# Altium schematic symbol library SparkFun.SCHLIB: 796 symbols (part 5 of 5)
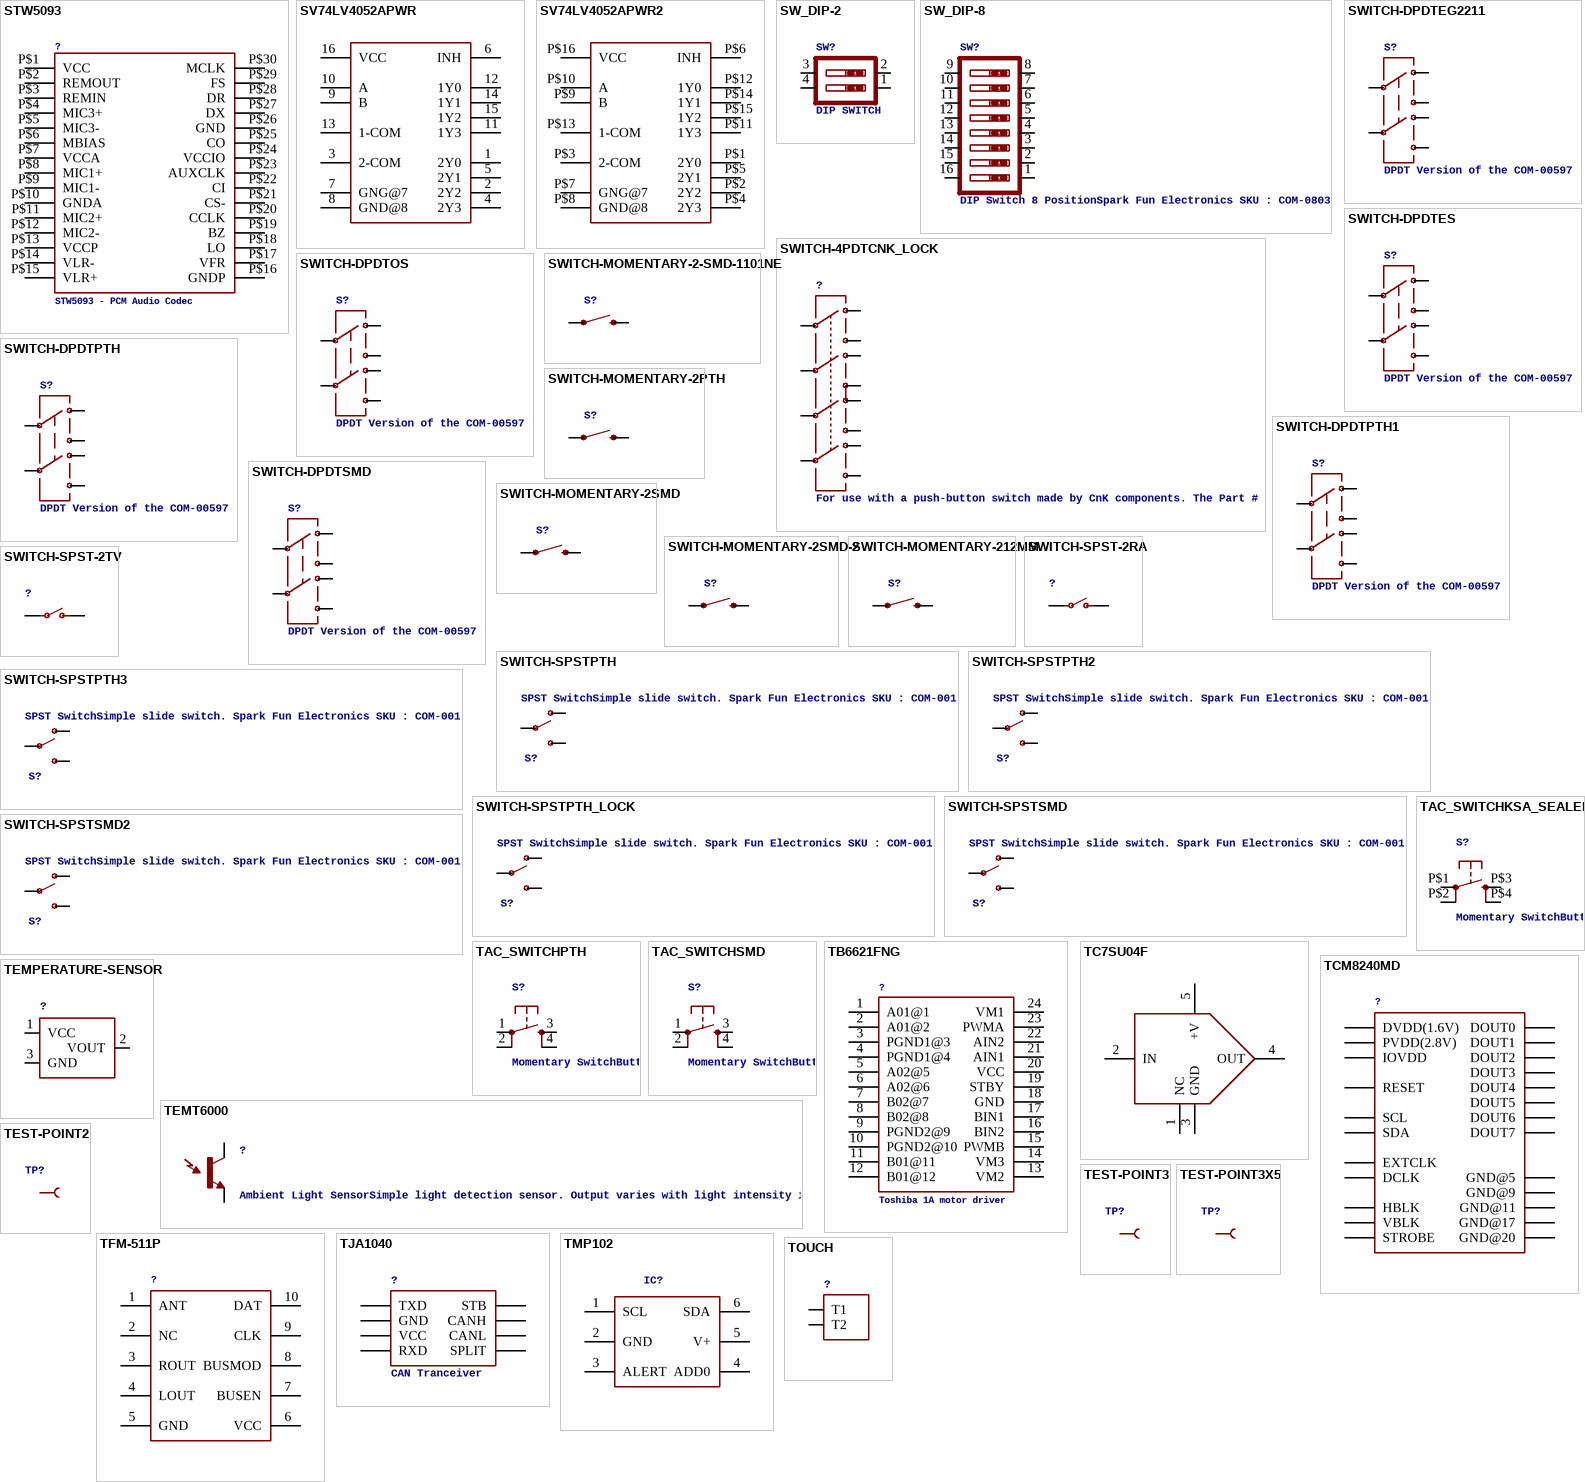
[diagram p40: symbols STW5093 to TOUCH]

## SWITCH-MOMENTARY-2SMD
designator S?
footprint TACTILE_SWITCH_SMD
pins: 1, 3 2

## SWITCH-MOMENTARY-2SMD-2
designator S?
footprint TACTILE_SWITCH_SMD-2
pins: 1 2, 2 1

## SWITCH-MOMENTARY-212MM
designator S?
footprint TACTILE-PTH-12MM
pins: 1, 3 2

## SWITCH-SPST-2RA
designator ?
footprint R_SW_TH
pins: P$3 O, P$4 P

## SWITCH-SPST-2TV
designator ?
footprint SWITCH-SPST-VERTICAL
pins: 1 O, 2 P

## SWITCH-SPSTPTH
designator S?, comment SPST SwitchSimple slide switch. Spark Fun Electronics SKU : COM-00102
footprint SWITCH-SPDT
pins: 1 O, 2 P, 3 S

## SWITCH-SPSTPTH2
designator S?, comment SPST SwitchSimple slide switch. Spark Fun Electronics SKU : COM-00102
footprint SWITCHE-DPDT
pins: 1 O, 2 P, 3 S

## SWITCH-SPSTPTH3
designator S?, comment SPST SwitchSimple slide switch. Spark Fun Electronics SKU : COM-00102
footprint R_SW_TH
pins: P$1 O, P$2 P, P$3 S

## SWITCH-SPSTPTH_LOCK
designator S?, comment SPST SwitchSimple slide switch. Spark Fun Electronics SKU : COM-00102
footprint SWITCH-SPDT_LOCK.007S
pins: 1 O, 2 P, 3 S

## SWITCH-SPSTSMD
designator S?, comment SPST SwitchSimple slide switch. Spark Fun Electronics SKU : COM-00102
footprint AYZ0202
pins: 1 O, 2 P, 3 S

## SWITCH-SPSTSMD2
designator S?, comment SPST SwitchSimple slide switch. Spark Fun Electronics SKU : COM-00102
footprint SWITCH-SPDT-SMD
pins: 1 O, 2 P, 3 S

## TAC_SWITCHKSA_SEALED
designator S?, comment Momentary SwitchButton commonly used for reset or general input. Spark Fun Electronics SKU : COM-00097
footprint KSA_SEALED_TAC_SWITCH
pins: P$1 1, P$2 2, P$3 3, P$4 4

## TAC_SWITCHPTH
designator S?, comment Momentary SwitchButton commonly used for reset or general input. Spark Fun Electronics SKU : COM-00097
footprint TACTILE-PTH
pins: 1, 2, 3, 4

## TAC_SWITCHSMD
designator S?, comment Momentary SwitchButton commonly used for reset or general input. Spark Fun Electronics SKU : COM-00097
footprint TACTILE_SWITCH_SMD
pins: 1, 2, 3, 4

## TB6621FNG
designator ?, comment Toshiba 1A motor driver
footprint SSOP24
pins: 1 A01@1, 2 A01@2, 3 PGND1@3, 4 PGND1@4, 5 A02@5, 6 A02@6, 7 B02@7, 8 B02@8, 9 PGND2@9, 10 PGND2@10, 11 B01@11, 12 B01@12, 13 VM2, 14 VM3, 15 PWMB, 16 BIN2, 17 BIN1, 18 GND, 19 STBY, 20 VCC, 21 AIN1, 22 AIN2, 23 PWMA, 24 VM1

## TC7SU04F
designator ?
footprint SOT23-5
pins: 1 NC, 2 IN, 3 GND, 4 OUT, 5 +V

## TCM8240MD
designator ?
footprint TCM8240MD
pins: P$1 DOUT3, P$2 DOUT2, P$3 DOUT1, P$4 DOUT0, P$5 GND@5, P$6 PVDD(2.8V), P$7 RESET, P$8 SCL, P$9 GND@9, P$10 SDA, P$11 GND@11, P$12 DVDD(1.6V), P$13 EXTCLK, P$14 STROBE, P$15 HBLK, P$16 VBLK, P$17 GND@17, P$18 IOVDD, P$19 DCLK, P$20 GND@20, P$21 DOUT7, P$22 DOUT6, P$23 DOUT5, P$24 DOUT4

## TEMPERATURE-SENSOR
designator ?
footprint TO-92
pins: 1 VCC, 2 VOUT, 3 GND

## TEMT6000
designator ?, comment Ambient Light SensorSimple light detection sensor. Output varies with light intensity input. Spark Fun Electronics SKU : COM-08348
footprint TEMT6000-SEN
pins: COLLECTOR C1, EMITTER E1

## TEST-POINT2
designator TP?
footprint PAD.02X.02
pins: P$1 1

## TEST-POINT3
designator TP?
footprint PAD.03X.03
pins: P$1 1

## TEST-POINT3X5
designator TP?
footprint PAD.03X.05
pins: P$1 1

## TFM-511P
designator ?
footprint TFM-511
pins: 1 ANT, 2 NC, 3 ROUT, 4 LOUT, 5 GND, 6 VCC, 7 BUSEN, 8 BUSMOD, 9 CLK, 10 DAT

## TJA1040
designator ?, comment CAN Tranceiver
footprint SO08
pins: 1 TXD, 2 GND, 3 VCC, 4 RXD, 5 SPLIT, 6 CANL, 7 CANH, 8 STB

## TMP102
designator IC?
footprint SOT563
pins: 1 SCL, 2 GND, 3 ALERT, 4 ADD0, 5 V+, 6 SDA

## TOUCH
designator ?
footprint TOUCH1
pins: P$1 T1, P$2 T2

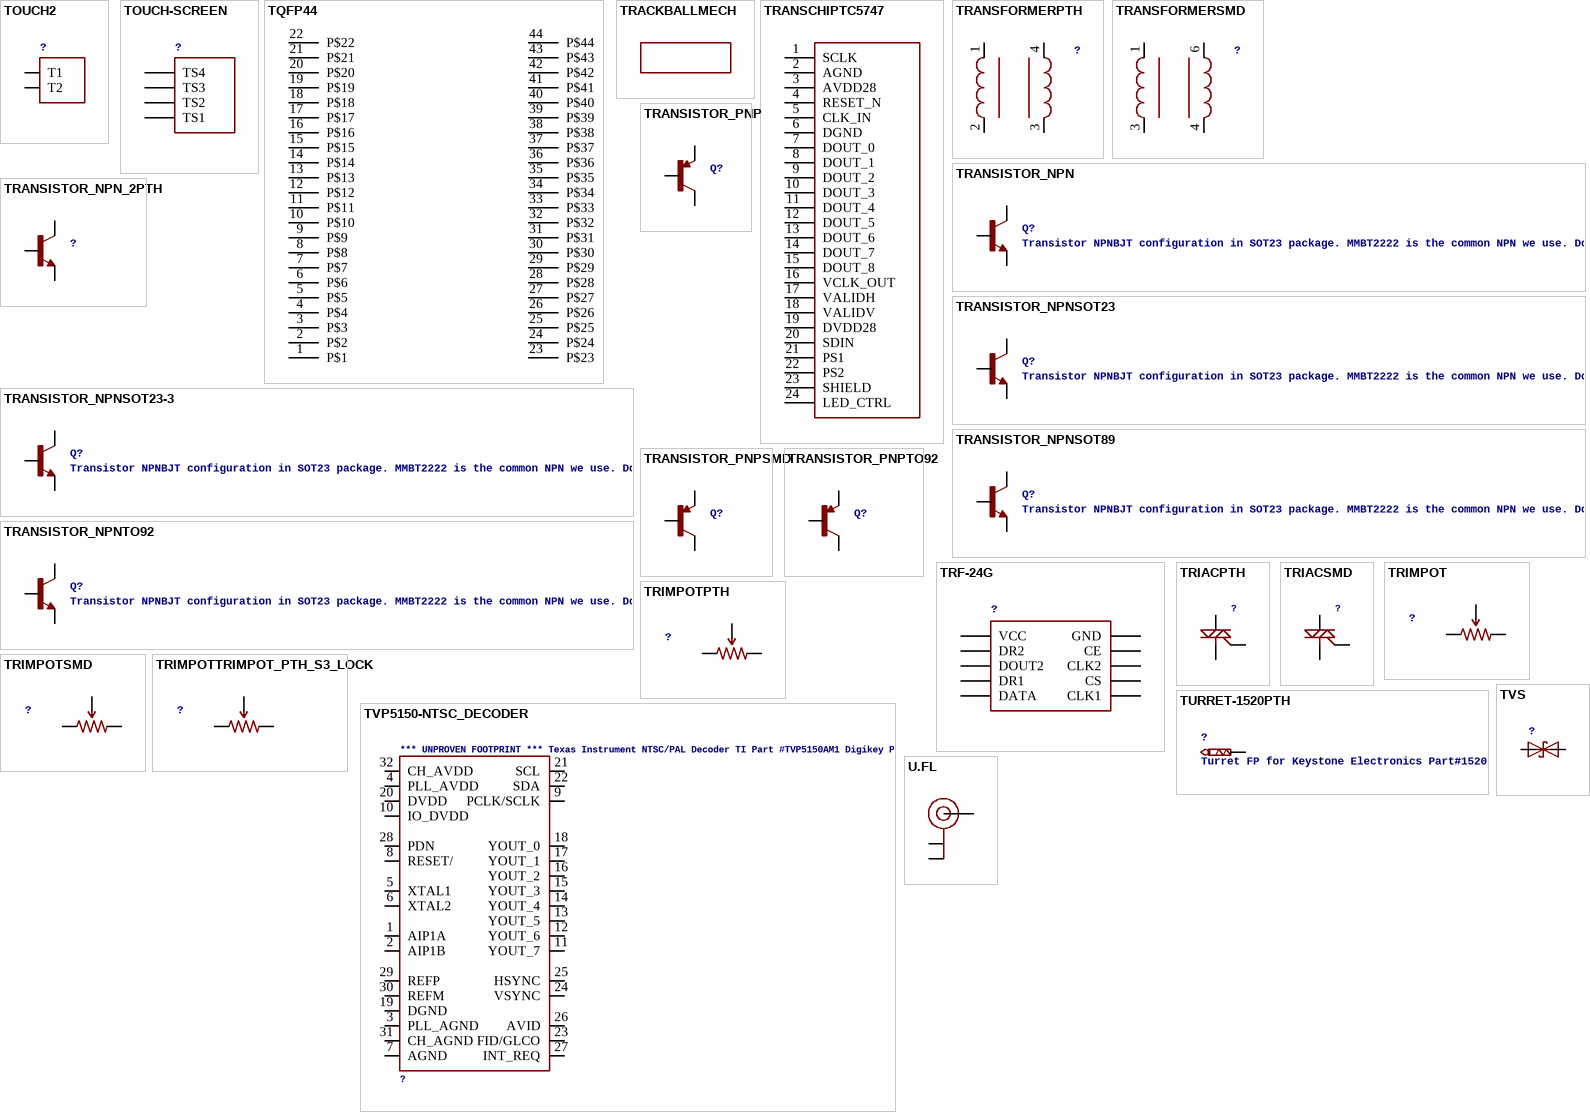
[diagram p32: symbols TOUCH2 to U.FL]

## TOUCH2
designator ?
footprint TOUCH2
pins: P$1 T1, P$4 T2

## TOUCH-SCREEN
designator ?
footprint TOUCH-SCREEN
pins: P$1 TS4, P$2 TS3, P$3 TS2, P$4 TS1

## TQFP44
designator ?
footprint TQFP44
pins: 1 P$1, 2 P$2, 3 P$3, 4 P$4, 5 P$5, 6 P$6, 7 P$7, 8 P$8, 9 P$9, 10 P$10, 11 P$11, 12 P$12, 13 P$13, 14 P$14, 15 P$15, 16 P$16, 17 P$17, 18 P$18, 19 P$19, 20 P$20, 21 P$21, 22 P$22, 23 P$23, 24 P$24, 25 P$25, 26 P$26, 27 P$27, 28 P$28, 29 P$29, 30 P$30, 31 P$31, 32 P$32, 33 P$33, 34 P$34, 35 P$35, 36 P$36, 37 P$37, 38 P$38, 39 P$39, 40 P$40, 41 P$41, 42 P$42, 43 P$43, 44 P$44

## TRACKBALLMECH
designator ?
footprint TRACKBALL

## TRANSCHIPTC5747
designator ?
footprint CAMERA_SFV24R-2ST_2
pins: 1 SCLK, 2 AGND, 3 AVDD28, 4 RESET_N, 5 CLK_IN, 6 DGND, 7 DOUT_0, 8 DOUT_1, 9 DOUT_2, 10 DOUT_3, 11 DOUT_4, 12 DOUT_5, 13 DOUT_6, 14 DOUT_7, 15 DOUT_8, 16 VCLK_OUT, 17 VALIDH, 18 VALIDV, 19 DVDD28, 20 SDIN, 21 PS1, 22 PS2, 23 SHIELD, 24 LED_CTRL

## TRANSFORMERPTH
designator ?
footprint TRANSFORMER
pins: 1, 2, 3, 4

## TRANSFORMERSMD
designator ?
footprint TRANSFORMER_SMD
pins: 1, 3 2, 4 3, 6 4

## TRANSISTOR_NPN
designator Q?, comment Transistor NPNBJT configuration in SOT23 package. MMBT2222 is the common NPN we use. Double check BCE configuration again layout.
footprint SOT223
pins: 1 B, 2 C, 3 E

## TRANSISTOR_NPN_2PTH
designator ?
footprint TO-92
pins: 1 C, 2 B, 3 E

## TRANSISTOR_NPNSOT23
designator Q?, comment Transistor NPNBJT configuration in SOT23 package. MMBT2222 is the common NPN we use. Double check BCE configuration again layout.
footprint SOT23
pins: 1 B, 2 E, 3 C

## TRANSISTOR_NPNSOT23-3
designator Q?, comment Transistor NPNBJT configuration in SOT23 package. MMBT2222 is the common NPN we use. Double check BCE configuration again layout.
footprint SOT23-3
pins: 1 B, 2 E, 3 C

## TRANSISTOR_NPNSOT89
designator Q?, comment Transistor NPNBJT configuration in SOT23 package. MMBT2222 is the common NPN we use. Double check BCE configuration again layout.
footprint SOT89
pins: 1 B, 2 C, 3 E

## TRANSISTOR_NPNTO92
designator Q?, comment Transistor NPNBJT configuration in SOT23 package. MMBT2222 is the common NPN we use. Double check BCE configuration again layout.
footprint TO-92
pins: 1 E, 2 B, 3 C

## TRANSISTOR_PNP
designator Q?
footprint SOT89
pins: 1 B, 2 C, 3 E

## TRANSISTOR_PNPSMD
designator Q?
footprint SOT23-3
pins: 1 B, 2 E, 3 C

## TRANSISTOR_PNPTO92
designator Q?
footprint TO-92
pins: 1 E, 2 B, 3 C

## TRF-24G
designator ?
footprint TRF-24G-SOCKET
pins: P$1 VCC, P$2 DR2, P$3 DOUT2, P$4 DR1, P$5 DATA, P$6 CLK1, P$7 CS, P$8 CLK2, P$9 CE, P$10 GND

## TRIACPTH
designator ?
footprint TO-92
pins: 1 M1, 2 G, 3 M2

## TRIACSMD
designator ?
footprint SOT223
pins: 1 M1, 2 M2, 3 G

## TRIMPOT
designator ?
footprint 3362U-2
pins: 1 CCW, 2 WIPER, 3 CW

## TRIMPOTPTH
designator ?
footprint TRIM_POT_PTH
pins: 1 CCW, 2 WIPER, 3 CW

## TRIMPOTSMD
designator ?
footprint TRIMPOT-3MM
pins: 1 CCW, 2 WIPER, 3 CW

## TRIMPOTTRIMPOT_PTH_S3_LOCK
designator ?
footprint TRIMPOT_PTH_S3_LOCK
pins: 1 CCW, 2 WIPER, 3 CW

## TURRET-1520PTH
designator ?, comment Turret FP for Keystone Electronics Part#1520
footprint 1X01_TURRET
pins: 1

## TVP5150-NTSC_DECODER
designator ?, comment *** UNPROVEN FOOTPRINT *** Texas Instrument NTSC/PAL Decoder TI Part #TVP5150AM1 Digikey Part # Decodes NTSC video signal to YCbCr 4:2:2 signal
footprint TQFP32-5MM
pins: 1 AIP1A, 2 AIP1B, 3 PLL_AGND, 4 PLL_AVDD, 5 XTAL1, 6 XTAL2, 7 AGND, 8 RESET/, 9 PCLK/SCLK, 10 IO_DVDD, 11 YOUT_7, 12 YOUT_6, 13 YOUT_5, 14 YOUT_4, 15 YOUT_3, 16 YOUT_2, 17 YOUT_1, 18 YOUT_0, 19 DGND, 20 DVDD, 21 SCL, 22 SDA, 23 FID/GLCO, 24 VSYNC, 25 HSYNC, 26 AVID, 27 INT_REQ, 28 PDN, 29 REFP, 30 REFM, 31 CH_AGND, 32 CH_AVDD

## TVS
designator ?
footprint SMA-DIODE
pins: A 1, C 2

## U.FL
designator ?
footprint U.FL
pins: P$1 GND@0, P$2 GND@1, P$3 SIGNAL

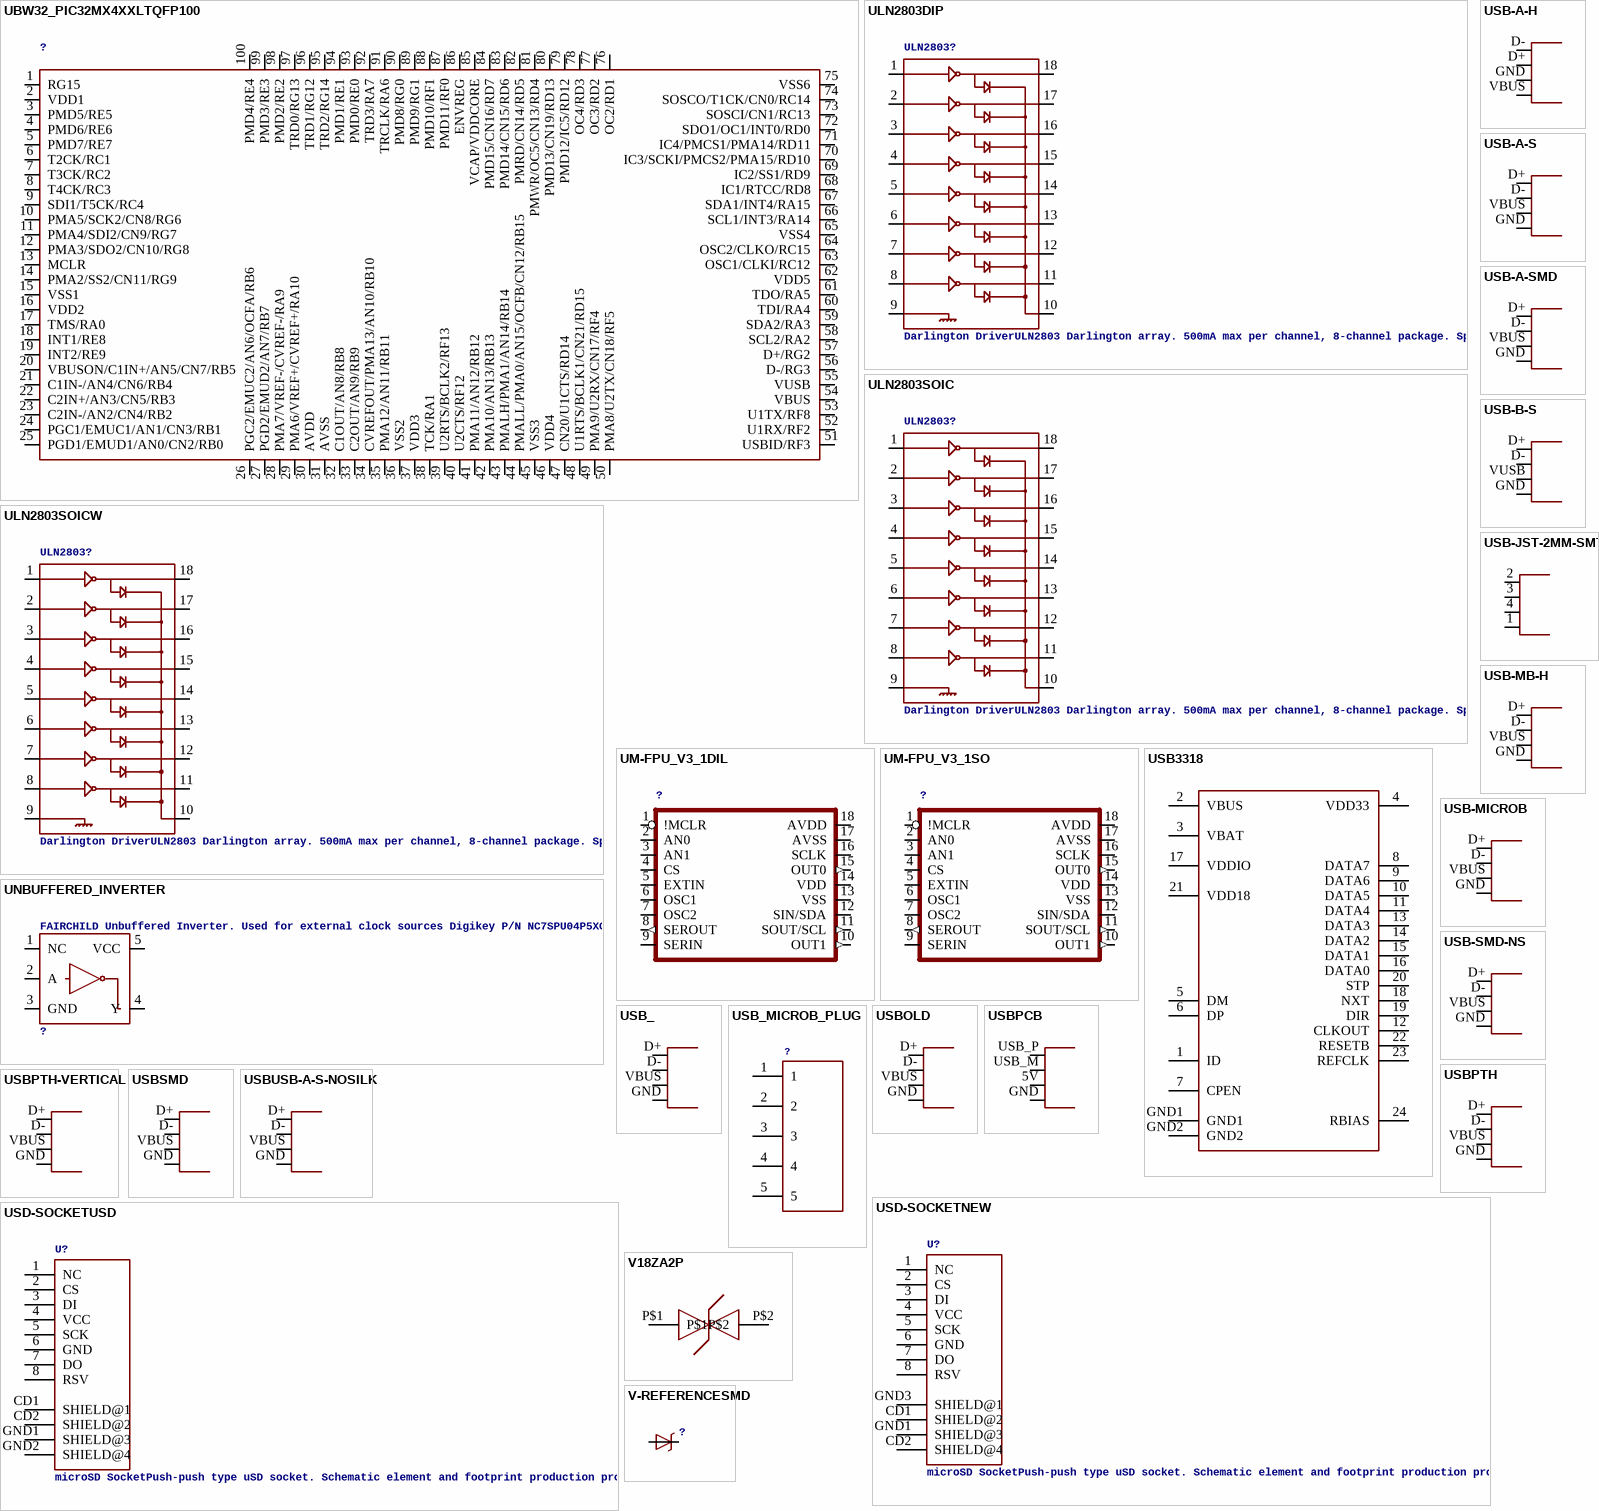
[diagram p33: symbols UBW32_PIC32MX4XXLTQFP100 to V-REFERENCESMD]

## UBW32_PIC32MX4XXLTQFP100
designator ?
footprint UBW32_TQFP100
pins: 1 RG15, 2 VDD1, 3 PMD5/RE5, 4 PMD6/RE6, 5 PMD7/RE7, 6 T2CK/RC1, 7 T3CK/RC2, 8 T4CK/RC3, 9 SDI1/T5CK/RC4, 10 PMA5/SCK2/CN8/RG6, 11 PMA4/SDI2/CN9/RG7, 12 PMA3/SDO2/CN10/RG8, 13 MCLR, 14 PMA2/SS2/CN11/RG9, 15 VSS1, 16 VDD2, 17 TMS/RA0, 18 INT1/RE8, 19 INT2/RE9, 20 VBUSON/C1IN+/AN5/CN7/RB5, 21 C1IN-/AN4/CN6/RB4, 22 C2IN+/AN3/CN5/RB3, 23 C2IN-/AN2/CN4/RB2, 24 PGC1/EMUC1/AN1/CN3/RB1, 25 PGD1/EMUD1/AN0/CN2/RB0, 26 PGC2/EMUC2/AN6/OCFA/RB6, 27 PGD2/EMUD2/AN7/RB7, 28 PMA7/VREF-/CVREF-/RA9, 29 PMA6/VREF+/CVREF+/RA10, 30 AVDD, 31 AVSS, 32 C1OUT/AN8/RB8, 33 C2OUT/AN9/RB9, 34 CVREFOUT/PMA13/AN10/RB10, 35 PMA12/AN11/RB11, 36 VSS2, 37 VDD3, 38 TCK/RA1, 39 U2RTS/BCLK2/RF13, 40 U2CTS/RF12, 41 PMA11/AN12/RB12, 42 PMA10/AN13/RB13, 43 PMALH/PMA1/AN14/RB14, 44 PMALL/PMA0/AN15/OCFB/CN12/RB15, 45 VSS3, 46 VDD4, 47 CN20/U1CTS/RD14, 48 U1RTS/BCLK1/CN21/RD15, 49 PMA9/U2RX/CN17/RF4, 50 PMA8/U2TX/CN18/RF5, 51 USBID/RF3, 52 U1RX/RF2, 53 U1TX/RF8, 54 VBUS, 55 VUSB, 56 D-/RG3, 57 D+/RG2, 58 SCL2/RA2, 59 SDA2/RA3, 60 TDI/RA4, 61 TDO/RA5, 62 VDD5, 63 OSC1/CLKI/RC12, 64 OSC2/CLKO/RC15, 65 VSS4, 66 SCL1/INT3/RA14, 67 SDA1/INT4/RA15, 68 IC1/RTCC/RD8, 69 IC2/SS1/RD9, 70 IC3/SCKI/PMCS2/PMA15/RD10, 71 IC4/PMCS1/PMA14/RD11, 72 SDO1/OC1/INT0/RD0, 73 SOSCI/CN1/RC13, 74 SOSCO/T1CK/CN0/RC14, 75 VSS6, 76 OC2/RD1, 77 OC3/RD2, 78 OC4/RD3, 79 PMD12/IC5/RD12, 80 PMD13/CN19/RD13, 81 PMWR/OC5/CN13/RD4, 82 PMRD/CN14/RD5, 83 PMD14/CN15/RD6, 84 PMD15/CN16/RD7, 85 VCAP/VDDCORE, 86 ENVREG, 87 PMD11/RF0, 88 PMD10/RF1, 89 PMD9/RG1, 90 PMD8/RG0, 91 TRCLK/RA6, 92 TRD3/RA7, 93 PMD0/RE0, 94 PMD1/RE1, 95 TRD2/RG14, 96 TRD1/RG12, 97 TRD0/RG13, 98 PMD2/RE2, 99 PMD3/RE3, 100 PMD4/RE4

## ULN2803DIP
designator ULN2803?, comment Darlington DriverULN2803 Darlington array. 500mA max per channel, 8-channel package. Spark Fun Electronics SKU : COM-00312
footprint DIL18
pins: 1, 2, 3, 4, 5, 6, 7, 8, 9, 10, 11, 12, 13, 14, 15, 16, 17, 18

## ULN2803SOIC
designator ULN2803?, comment Darlington DriverULN2803 Darlington array. 500mA max per channel, 8-channel package. Spark Fun Electronics SKU : COM-00312
footprint SO018
pins: 1, 2, 3, 4, 5, 6, 7, 8, 9, 10, 11, 12, 13, 14, 15, 16, 17, 18

## ULN2803SOICW
designator ULN2803?, comment Darlington DriverULN2803 Darlington array. 500mA max per channel, 8-channel package. Spark Fun Electronics SKU : COM-00312
footprint SO18L
pins: 1, 2, 3, 4, 5, 6, 7, 8, 9, 10, 11, 12, 13, 14, 15, 16, 17, 18

## UM-FPU_V3_1DIL
designator ?
footprint DIL18
pins: 1 !MCLR, 2 AN0, 3 AN1, 4 CS, 5 EXTIN, 6 OSC1, 7 OSC2, 8 SEROUT (out), 9 SERIN, 10 OUT1 (out), 11 SOUT/SCL (out), 12 SIN/SDA, 13 VSS (power), 14 VDD (power), 15 OUT0 (out), 16 SCLK, 17 AVSS (power), 18 AVDD (power)

## UM-FPU_V3_1SO
designator ?
footprint SOIC18-W
pins: 1 !MCLR, 2 AN0, 3 AN1, 4 CS, 5 EXTIN, 6 OSC1, 7 OSC2, 8 SEROUT (out), 9 SERIN, 10 OUT1 (out), 11 SOUT/SCL (out), 12 SIN/SDA, 13 VSS (power), 14 VDD (power), 15 OUT0 (out), 16 SCLK, 17 AVSS (power), 18 AVDD (power)

## UNBUFFERED_INVERTER
designator ?, comment FAIRCHILD Unbuffered Inverter. Used for external clock sources Digikey P/N NC7SPU04P5XCT-ND
footprint SC70
pins: 1 NC, 2 A, 3 GND, 4 Y, 5 VCC

## USB3318
designator ?
footprint QFN-24-USB
pins: 1 ID, 2 VBUS, 3 VBAT, 4 VDD33, 5 DM, 6 DP, 7 CPEN, 8 DATA7, 9 DATA6, 10 DATA5, 11 DATA4, 12 CLKOUT, 13 DATA3, 14 DATA2, 15 DATA1, 16 DATA0, 17 VDDIO, 18 NXT, 19 DIR, 20 STP, 21 VDD18, 22 RESETB, 23 REFCLK, 24 RBIAS, GND1, GND2

## USB-A-H
designator X?, comment USB Connectors   USB-B-PTH is fully proven SKU : PRT-00139    USB-miniB is fully proven SKU : PRT-00587    USB-A-PCB is untested.    USB-A-H is throughly reviewed, but untested. Spark Fun Electronics SKU : PRT-00437    USB-B-SMT is throughly reviewed, but untested. Needs silkscreen touching up.    USB-A-S has not been used/tested    USB-MB-H has not been used/tested  (value not drawn)
footprint USB-A-H
pins: D+ D-, D- D+, GND VBUS, VBUS GND

## USB-A-S
designator X?, comment USB Connectors   USB-B-PTH is fully proven SKU : PRT-00139    USB-miniB is fully proven SKU : PRT-00587    USB-A-PCB is untested.    USB-A-H is throughly reviewed, but untested. Spark Fun Electronics SKU : PRT-00437    USB-B-SMT is throughly reviewed, but untested. Needs silkscreen touching up.    USB-A-S has not been used/tested    USB-MB-H has not been used/tested  (value not drawn)
footprint USB-A-S
pins: D+, D-, GND, VBUS

## USB-A-SMD
designator X?, comment USB Connectors   USB-B-PTH is fully proven SKU : PRT-00139    USB-miniB is fully proven SKU : PRT-00587    USB-A-PCB is untested.    USB-A-H is throughly reviewed, but untested. Spark Fun Electronics SKU : PRT-00437    USB-B-SMT is throughly reviewed, but untested. Needs silkscreen touching up.    USB-A-S has not been used/tested    USB-MB-H has not been used/tested  (value not drawn)
footprint USB-A-S-NOSILK-FEMALE
pins: D+, D-, GND, VBUS

## USB-B-S
designator X?, comment USB Connectors   USB-B-PTH is fully proven SKU : PRT-00139    USB-miniB is fully proven SKU : PRT-00587    USB-A-PCB is untested.    USB-A-H is throughly reviewed, but untested. Spark Fun Electronics SKU : PRT-00437    USB-B-SMT is throughly reviewed, but untested. Needs silkscreen touching up.    USB-A-S has not been used/tested    USB-MB-H has not been used/tested  (value not drawn)
footprint USB-B-SMT
pins: D+, D-, GND, VUSB VBUS

## USB-JST-2MM-SMT
designator X?, comment USB Connectors   USB-B-PTH is fully proven SKU : PRT-00139    USB-miniB is fully proven SKU : PRT-00587    USB-A-PCB is untested.    USB-A-H is throughly reviewed, but untested. Spark Fun Electronics SKU : PRT-00437    USB-B-SMT is throughly reviewed, but untested. Needs silkscreen touching up.    USB-A-S has not been used/tested    USB-MB-H has not been used/tested  (value not drawn)
footprint S4B-PH
pins: 1 GND, 2 D+, 3 D-, 4 VBUS

## USB-MB-H
designator X?, comment USB Connectors   USB-B-PTH is fully proven SKU : PRT-00139    USB-miniB is fully proven SKU : PRT-00587    USB-A-PCB is untested.    USB-A-H is throughly reviewed, but untested. Spark Fun Electronics SKU : PRT-00437    USB-B-SMT is throughly reviewed, but untested. Needs silkscreen touching up.    USB-A-S has not been used/tested    USB-MB-H has not been used/tested  (value not drawn)
footprint USB-MB-H
pins: D+, D-, GND, VBUS

## USB-MICROB
designator X?, comment USB Connectors   USB-B-PTH is fully proven SKU : PRT-00139    USB-miniB is fully proven SKU : PRT-00587    USB-A-PCB is untested.    USB-A-H is throughly reviewed, but untested. Spark Fun Electronics SKU : PRT-00437    USB-B-SMT is throughly reviewed, but untested. Needs silkscreen touching up.    USB-A-S has not been used/tested    USB-MB-H has not been used/tested  (value not drawn)
footprint USB-MICROB
pins: D+, D-, GND, VBUS

## USB-SMD-NS
designator X?, comment USB Connectors   USB-B-PTH is fully proven SKU : PRT-00139    USB-miniB is fully proven SKU : PRT-00587    USB-A-PCB is untested.    USB-A-H is throughly reviewed, but untested. Spark Fun Electronics SKU : PRT-00437    USB-B-SMT is throughly reviewed, but untested. Needs silkscreen touching up.    USB-A-S has not been used/tested    USB-MB-H has not been used/tested  (value not drawn)
footprint USB-MINIB-NOSTOP
pins: D+, D-, GND, VBUS

## USB_
designator X?, comment USB Connectors   USB-B-PTH is fully proven SKU : PRT-00139    USB-miniB is fully proven SKU : PRT-00587    USB-A-PCB is untested.    USB-A-H is throughly reviewed, but untested. Spark Fun Electronics SKU : PRT-00437    USB-B-SMT is throughly reviewed, but untested. Needs silkscreen touching up.    USB-A-S has not been used/tested    USB-MB-H has not been used/tested  (value not drawn)
footprint USB-A-S-SILK-FEMALE
pins: D+, D-, GND, VBUS

## USB_MICROB_PLUG
designator ?
footprint MICRO-B-RA-SMT
pins: 1, 2, 3, 4, 5

## USBOLD
designator X?, comment USB Connectors   USB-B-PTH is fully proven SKU : PRT-00139    USB-miniB is fully proven SKU : PRT-00587    USB-A-PCB is untested.    USB-A-H is throughly reviewed, but untested. Spark Fun Electronics SKU : PRT-00437    USB-B-SMT is throughly reviewed, but untested. Needs silkscreen touching up.    USB-A-S has not been used/tested    USB-MB-H has not been used/tested  (value not drawn)
footprint USB-MINIB-OLD
pins: D+, D-, GND, VBUS

## USBPCB
designator X?, comment USB Connectors   USB-B-PTH is fully proven SKU : PRT-00139    USB-miniB is fully proven SKU : PRT-00587    USB-A-PCB is untested.    USB-A-H is throughly reviewed, but untested. Spark Fun Electronics SKU : PRT-00437    USB-B-SMT is throughly reviewed, but untested. Needs silkscreen touching up.    USB-A-S has not been used/tested    USB-MB-H has not been used/tested  (value not drawn)
footprint USB-A-PCB
pins: 5V VBUS, GND, USB_M D-, USB_P D+

## USBPTH
designator X?, comment USB Connectors   USB-B-PTH is fully proven SKU : PRT-00139    USB-miniB is fully proven SKU : PRT-00587    USB-A-PCB is untested.    USB-A-H is throughly reviewed, but untested. Spark Fun Electronics SKU : PRT-00437    USB-B-SMT is throughly reviewed, but untested. Needs silkscreen touching up.    USB-A-S has not been used/tested    USB-MB-H has not been used/tested  (value not drawn)
footprint USB-B-PTH
pins: D+, D-, GND, VBUS

## USBPTH-VERTICAL
designator X?, comment USB Connectors   USB-B-PTH is fully proven SKU : PRT-00139    USB-miniB is fully proven SKU : PRT-00587    USB-A-PCB is untested.    USB-A-H is throughly reviewed, but untested. Spark Fun Electronics SKU : PRT-00437    USB-B-SMT is throughly reviewed, but untested. Needs silkscreen touching up.    USB-A-S has not been used/tested    USB-MB-H has not been used/tested  (value not drawn)
footprint USB-B-PTH-VERTICAL
pins: D+, D-, GND, VBUS

## USBSMD
designator X?, comment USB Connectors   USB-B-PTH is fully proven SKU : PRT-00139    USB-miniB is fully proven SKU : PRT-00587    USB-A-PCB is untested.    USB-A-H is throughly reviewed, but untested. Spark Fun Electronics SKU : PRT-00437    USB-B-SMT is throughly reviewed, but untested. Needs silkscreen touching up.    USB-A-S has not been used/tested    USB-MB-H has not been used/tested  (value not drawn)
footprint USB-MINIB
pins: D+, D-, GND, VBUS

## USBUSB-A-S-NOSILK
designator X?, comment USB Connectors   USB-B-PTH is fully proven SKU : PRT-00139    USB-miniB is fully proven SKU : PRT-00587    USB-A-PCB is untested.    USB-A-H is throughly reviewed, but untested. Spark Fun Electronics SKU : PRT-00437    USB-B-SMT is throughly reviewed, but untested. Needs silkscreen touching up.    USB-A-S has not been used/tested    USB-MB-H has not been used/tested  (value not drawn)
footprint USB-A-S-NOSILK
pins: D+, D-, GND, VBUS
